# Altium footprint library Conectors.PcbLib: 122 footprints (part 8 of 8)
Each footprint in its own frame and in the unit in brackets; x right, y up, seen from the top. Pads: shape width x height; smd on the part's side, far side on the other; paste and mask are expansions set on the pad; w line width, h text height; cw(c..) or ccw(c..) is an arc to the next point about the centre after c.
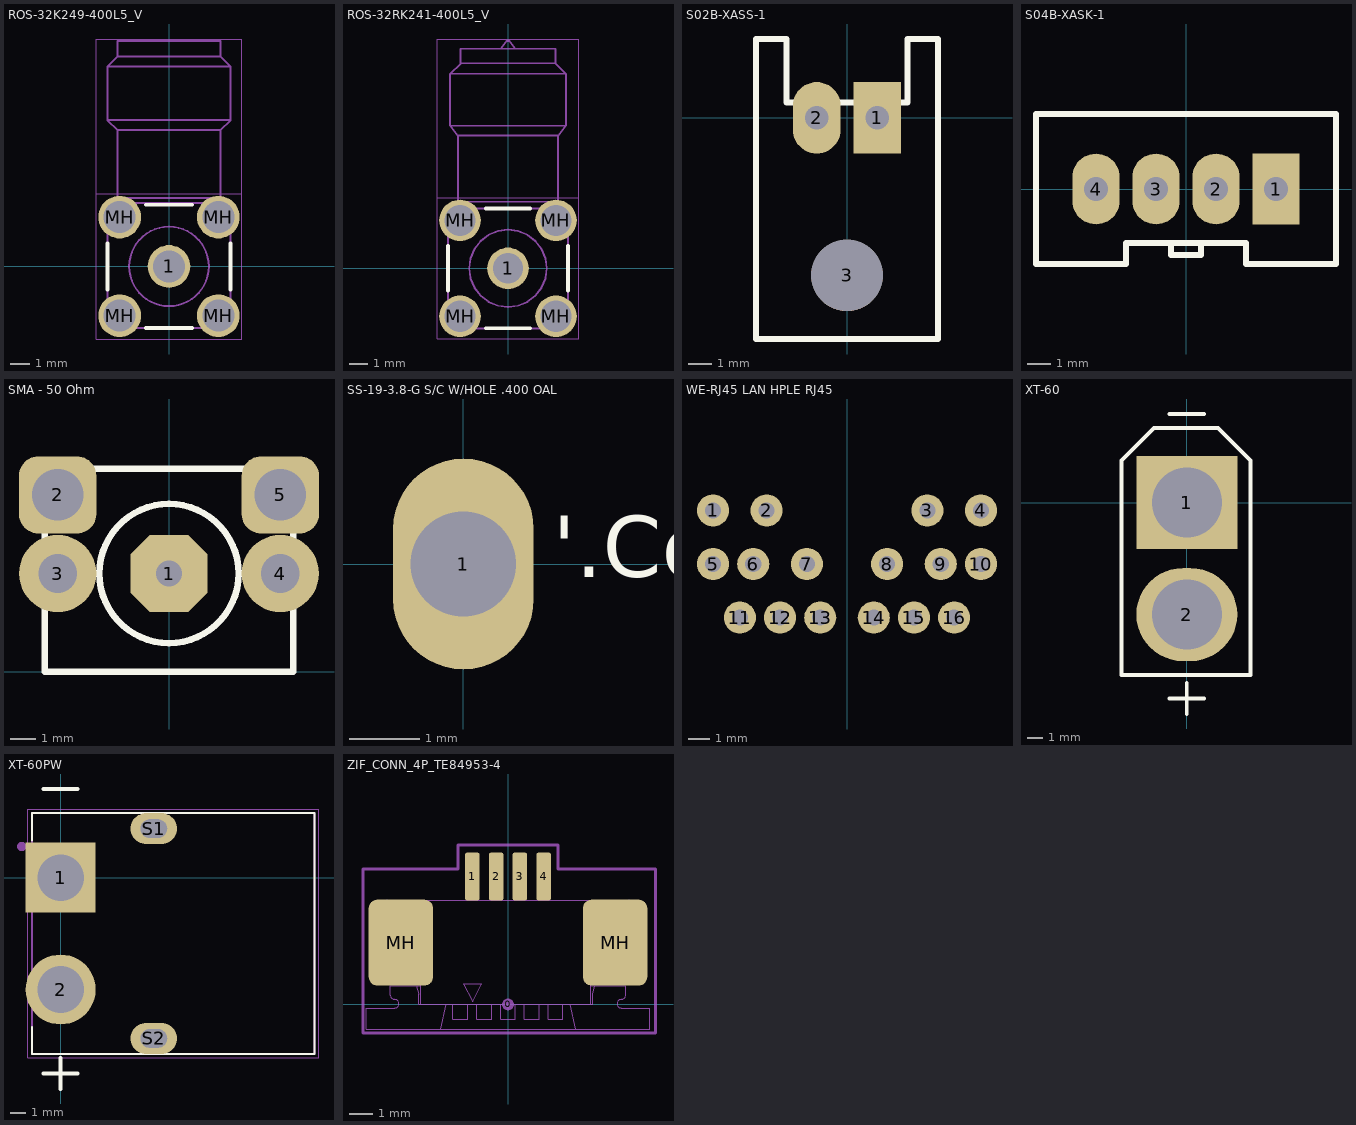
[diagram p7: the footprints below, top view; thin cyan lines are the x and y axes]

## ROS-32K249-400L5_V [mm] "SMA Right Angle Jack, 14.8x6.35x9.7mm, Rosenberger Recommended"
height 9.7
pads (5):
  round 2.2 hole 1.65: 1(0,0) MH(-2.54,-2.54) MH(-2.54,2.54) MH(2.54,-2.54) MH(2.54,2.54)
Top Overlay:
  lines w0.2: -3.175,-1.181 -3.175,1.181 ; -1.181,-3.175 1.181,-3.175 ; -1.181,3.175 1.181,3.175 ; 3.175,-1.181 3.175,1.181
Mechanical 13:
  circle w0.1: c0,0 r0.635
  circle w0.1: c0,0 r2.05
  lines w0.1: -3.175,-1.708 -2.161,-1.708 -2.02,-1.874 -1.866,-2.028 -1.7,-2.17 -1.7,-3.183 ; -3.175,1.708 -2.161,1.708 -2.02,1.874 -1.866,2.028 -1.7,2.17 -1.7,3.183 -2.9,3.183 -3.175,2.908 -3.175,-2.908 -2.9,-3.183 ; -2.9,-3.183 2.9,-3.183 ; 1.7,-3.183 1.7,-2.17 1.866,-2.028 2.02,-1.874 2.161,-1.708 3.175,-1.708 ; 2.9,-3.183 3.175,-2.908 3.175,2.908 2.9,3.183 1.7,3.183 1.7,2.17 1.866,2.028 2.02,1.874 2.161,1.708 3.175,1.708 ; -3.175,7.542 -3.175,10.292 ; -3.175,7.542 3.175,7.542 ; -3.175,7.542 -2.65,7.017 ; -3.175,10.292 3.175,10.292 ; -3.175,10.292 -2.65,10.817 ; -2.65,3.517 -2.65,7.017 ; -2.65,3.517 2.65,3.517 ; -2.65,3.517 -2.9,3.267 2.9,3.267 2.65,3.517 ; -2.65,7.017 2.65,7.017 ; -2.65,10.817 2.65,10.817 ; -2.65,10.817 -2.65,11.617 2.65,11.617 2.65,10.817 ; 2.65,3.517 2.65,7.017 ; 2.65,7.017 3.175,7.542 ; 2.65,10.817 3.175,10.292 ; 3.175,7.542 3.175,10.292 ; -3.04,-3.048 -2.04,-3.048 -2.04,-2.048 -3.04,-2.048 -3.04,-3.048 ; -3.04,2.032 -3.04,3.032 -2.04,3.032 -2.04,2.032 -3.04,2.032 ; 2.04,-3.048 2.04,-2.048 3.04,-2.048 3.04,-3.048 2.04,-3.048 ; 2.04,2.032 3.04,2.032 3.04,3.032 2.04,3.032 2.04,2.032
Mechanical 15:
  lines w0.05: -3.74,3.74 3.74,3.74 ; -3.74,-3.74 3.74,-3.74 3.74,11.717 -3.74,11.717 -3.74,-3.74
  lines w0.1: -0.5,0 0.5,0 ; 0,-0.5 0,0.5
3D body "32k249-400l5.stp": height 9.7, standoff -4, extent -3.175,-3.183 3.175,11.617

## ROS-32RK241-400L5_V [mm] "Reverse-SMA Straight Jack, 15.215x6.35x9.7mm, Rosenberger Recommended"
height 9.7
pads (5):
  round 2.2 hole 1.6: 1(0,0)
  round 2.2 hole 1.65: MH(-2.54,-2.54) MH(-2.54,2.54) MH(2.54,-2.54) MH(2.54,2.54)
Top Overlay:
  lines w0.2: -3.175,-1.181 -3.175,1.181 ; -1.181,-3.175 1.181,-3.175 ; -1.181,3.175 1.181,3.175 ; 3.175,-1.181 3.175,1.181
Mechanical 13:
  circle w0.1: c0,0 r0.635
  lines w0.1: -3.175,-2.9 -3.175,2.9 -3.086,2.995 -2.994,3.086 ; -3.175,-2.9 -3.086,-2.994 -2.995,-3.086 -2.9,-3.175 2.905,-3.175 ; -3.175,-1.7 -2.161,-1.7 ; -3.175,1.7 -2.162,1.7 ; -2.9,3.175 -2.994,3.086 ; -2.65,4.036 -2.65,7.02 -2.65,3.525 ; -2.161,-1.7 -2.02,-1.866 -1.866,-2.02 -1.7,-2.162 ; -2.162,1.7 -2.02,1.866 -1.866,2.02 -1.7,2.161 ; -1.7,-3.175 -1.7,-2.162 ; -1.7,2.161 -1.7,3.175 ; -0.375,11.625 -0.071,12.04 0.071,12.04 0.375,11.625 ; 1.7,-2.161 1.866,-2.02 2.02,-1.866 2.162,-1.7 ; 1.7,2.162 1.866,2.02 2.02,1.866 2.161,1.7 ; 1.7,-3.175 1.7,-2.161 ; 1.7,2.162 1.7,3.175 ; 2.162,-1.7 3.175,-1.7 ; 2.161,1.7 3.175,1.7 ; 2.65,4.036 2.65,7.02 2.65,3.525 ; 2.9,-3.175 2.994,-3.086 3.086,-2.995 3.175,-2.9 ; 3.175,-2.905 3.175,2.9 ; 3.175,2.9 3.086,2.994 2.995,3.086 ; -3.067,7.55 -2.65,7.025 ; -3.067,7.55 -3.067,10.3 ; -3.067,7.55 3.067,7.55 ; -3.067,7.55 -2.65,7.025 ; -3.067,7.55 -3.067,10.3 ; -3.067,10.3 -2.512,10.825 -3.067,10.3 ; -3.067,10.3 3.067,10.3 ; -2.995,3.086 -2.9,3.175 ; -2.9,3.175 -2.65,3.525 ; -2.9,3.175 2.9,3.175 ; -2.65,3.525 2.65,3.525 ; -2.65,7.025 2.65,7.025 ; -2.512,10.855 -2.512,11.625 ; -2.512,10.855 2.512,10.855 ; -2.512,10.855 -2.512,11.625 ; -2.512,11.625 2.511,11.625 -2.512,11.625 ; 2.512,10.855 2.512,11.625 2.512,10.855 ; 2.512,10.855 3.067,10.3 ; 2.512,10.855 3.067,10.3 ; 2.65,3.525 2.9,3.175 ; 2.65,7.025 3.067,7.55 ; 2.65,7.025 3.067,7.55 ; 2.9,3.175 2.995,3.086 ; 2.9,3.175 2.995,3.086 ; 3.067,7.55 3.067,10.3 ; 3.067,7.55 3.067,10.3 ; -3.04,-3.04 -2.04,-3.04 -2.04,-2.04 -3.04,-2.04 -3.04,-3.04 ; -3.04,2.04 -2.04,2.04 -2.04,3.04 -3.04,3.04 -3.04,2.04 ; -2.05,0 -1.98,0.531 -1.775,1.025 -1.449,1.45 -1.025,1.775 -0.53,1.98 0,2.05 0.531,1.98 1.025,1.775 1.45,1.449 1.775,1.025 1.98,0.53 2.05,0 1.98,-0.531 1.775,-1.025 1.449,-1.45 1.025,-1.775 0.53,-1.98 0,-2.05 -0.531,-1.98 -1.025,-1.775 -1.45,-1.449 -1.775,-1.025 -1.98,-0.53 -2.05,0 ; 2.04,-3.04 3.04,-3.04 3.04,-2.04 2.04,-2.04 2.04,-3.04 ; 2.04,2.04 3.04,2.04 3.04,3.04 2.04,3.04 2.04,2.04
Mechanical 15:
  lines w0.05: -3.74,3.74 3.74,3.74 ; -3.74,-3.74 3.74,-3.74 3.74,12.14 -3.74,12.14 -3.74,-3.74
3D body "32rk241-400l5.stp": height 9.7, standoff -4, extent -3.175,-3.175 3.175,12.04

## S02B-XASS-1 [mm] "CONN HEADER XA 2POS 2.5MM TIN"
height 11.3
pads (3):
  rect 2x3 hole 1: 1(1.27,0)
  oval 2x3 hole 1: 2(-1.27,0)
  round 3 hole 3 unplated: 3(0,-6.604)
Top Overlay:
  lines w0.254: -3.81,-9.271 3.81,-9.271 3.81,3.302 2.54,3.302 2.54,0.635 -2.54,0.635 -2.54,3.302 -3.81,3.302 -3.81,-9.271
3D body "S02B-XASS-1.STEP": height 7.6, standoff -3.5, extent -3.75,-9.253 3.75,3.347

## S04B-XASK-1 [mm] "CONN HEADER XA 4POS 2.5MM TIN"
height 11.3
pads (4):
  rect 2x3 hole 1: 1(3.81,0)
  oval 2x3 hole 1: 2(1.27,0) 3(-1.27,0) 4(-3.81,0)
Top Overlay:
  lines w0.254: -0.635,-2.286 -0.635,-2.794 0,-2.794 0.635,-2.794 0.635,-2.286 ; -6.35,-3.175 -6.35,3.175 6.35,3.175 6.35,-3.175 2.54,-3.175 2.54,-2.286 -2.54,-2.286 -2.54,-3.175 -6.35,-3.175
3D body "S04B-XASK-1.STEP": height 7.6, standoff -3.5, extent -6.25,-9.38 6.25,3.22

## SMA - 50 Ohm [mm]
pads (5):
  oct 3x3 hole 1: 1(0,3.81)
  rrect50% 3x3 hole 2: 2(-4.318,6.858) 5(4.318,6.858)
  round 3 hole 1.5: 3(-4.318,3.81) 4(4.318,3.81)
Top Overlay:
  circle w0.254: c0,3.81 r2.7
  lines w0.254: -4.826,0 -4.826,7.874 4.826,7.874 4.826,0 -4.826,0
3D body "User Library-Johnson Components SMA - 50 Ohm Connectors 142-0701-801.step": height 11.6, standoff -2.67, extent -4.76,0 4.76,7.92

## SS-19-3.8-G S/C W/HOLE .400 OAL [mm]
pads (1):
  oval 2x3 hole 1.5: 1(0,0)
Top Overlay:
  text "'.Comment'" at 1.27,-0.481 h1.5
3D body: height 6.76, standoff -2, extent -0.568,-0.569 0.568,0.569
3D body: height 8.16, standoff -2, extent -0.568,-0.569 0.568,0.569
3D body: height 5.24, standoff -2, extent -0.682,-0.683 0.682,0.684

## WE-RJ45 LAN HPLE RJ45 [mil] "WE-RJ45 LAN HPLE RJ45 LAN Transformer"
pads (16):
  round 60 hole 30: 1(-250,575) 2(-150,575) 3(150,575) 4(250,575) 5(-250,475) 6(-175,475) 7(-75,475) 8(75,475) 9(175,475) 10(250,475) 11(-200,375) 12(-125,375) 13(-50,375) 14(50,375) 15(125,375) 16(200,375)
3D body "User Library-WE-RJ45 LAN HPLE RJ45 LAN Transformer_799111614_WurthElektronik.step": height 586.61, standoff -157.48, extent -391.14,-650 391.14,650

## XT-60 [mm]
pads (2):
  rect 6.5x6 hole 4.5: 1(0,0)
  oval 6.5x6 hole 4.5: 2(0,-7.2)
Top Overlay:
  lines w0.25: -1.1,-12.6 1.1,-12.6 ; -1.1,5.7 1.1,5.7 ; 0,-13.6 0,-11.6 ; -4.2,-11.1 4.1,-11.1 4.1,2.7 2,4.8 -2.1,4.8 -4.2,2.7 -4.2,-11.1
3D body "XT60 male.step": height 20, standoff -1.2, extent -4.1,-11.15 4.05,4.75

## XT-60PW [mm]
pads (4):
  rect 4.5x4.5 hole 3: 1(0,0)
  round 4.5 hole 3: 2(0,-7.2)
  oval 3x2 hole 1.2 slot 1.7 at 0 deg: S1(6,3.15) S2(6,-10.35)
Top Overlay:
  lines w0.127: -1.85,-9.6 -1.85,-11.35 16.35,-11.35 16.35,4.15 -1.85,4.15 -1.85,2.4
  lines w0.25: -1.1,-12.6 1.1,-12.6 ; -1.1,5.7 1.1,5.7 ; 0,-13.6 0,-11.6
Mechanical 13:
  circle w0.3: c-2.5,2 r0.15
  lines w0.127: -1.85,-11.35 -1.85,4.15 16.35,4.15 16.35,-11.35 -1.85,-11.35
Mechanical 15:
  lines w0.05: -2.1,-11.6 16.6,-11.6 16.6,4.4 -2.1,4.4 -2.1,-11.6
3D body "XT60IPW.step": height 8.2, standoff -2.75, extent -1.3,-11.25 16.3,4.25

## ZIF_CONN_4P_TE84953-4 [mm] "TE Connectivity 4-pin ZIF connector"
height 2.74
pads (7):
  round 0.5 on Mech15: 0(0,0)
  rrect25% 0.61x2 smd: 1(-1.5,5.375) 2(-0.5,5.375) 3(0.5,5.375) 4(1.5,5.375)
  rrect25% 2.7x3.6 smd: MH(-4.5,2.6) MH(4.5,2.6)
Mechanical 13:
  lines w0.05: -4.56,3.1 -3.93,3.1 ; -4.56,4.37 -4.56,0.87 -3.67,0.87 -3.67,0 ; -4.28,4.37 -4.18,3.997 -4.18,3.1 ; -4.18,0.86 -4.18,0.87 ; -3.982,0.87 -3.982,0.86 -5.072,0.86 cw(c-5.072,0.96) -5.172,0.96 -5.172,1.261 cw(c-5.072,1.261) -5.072,1.361 -4.762,1.361 ccw(c-4.762,1.461) -4.662,1.461 -4.662,1.763 ccw(c-4.762,1.763) -4.762,1.863 -5.072,1.863 cw(c-5.072,1.963) -5.172,1.963 -5.172,2.264 cw(c-5.072,2.264) -5.072,2.364 -4.762,2.364 ccw(c-4.762,2.464) -4.662,2.464 -4.662,2.766 ccw(c-4.762,2.766) -4.762,2.866 -5.072,2.866 cw(c-5.072,2.966) -5.172,2.966 -5.172,3.267 cw(c-5.072,3.267) -5.072,3.367 -4.762,3.367 ccw(c-4.762,3.467) -4.662,3.467 -4.662,3.769 ccw(c-4.762,3.769) -4.762,3.869 -5.072,3.869 cw(c-5.072,3.969) -5.172,3.969 -5.172,4.27 cw(c-5.072,4.27) -5.072,4.37 5.072,4.37 cw(c5.072,4.27) 5.172,4.27 5.172,3.969 cw(c5.072,3.969) 5.072,3.869 4.762,3.869 ccw(c4.762,3.769) 4.662,3.769 4.662,3.467 ccw(c4.762,3.467) 4.762,3.367 5.072,3.367 cw(c5.072,3.267) 5.172,3.267 5.172,2.966 cw(c5.072,2.966) 5.072,2.866 4.762,2.866 ccw(c4.762,2.766) 4.662,2.766 4.662,2.464 ccw(c4.762,2.464) 4.762,2.364 5.072,2.364 cw(c5.072,2.264) 5.172,2.264 5.172,1.963 cw(c5.072,1.963) 5.072,1.863 4.762,1.863 ccw(c4.762,1.763) 4.662,1.763 4.662,1.461 ccw(c4.762,1.461) 4.762,1.361 5.072,1.361 cw(c5.072,1.261) 5.172,1.261 5.172,0.96 cw(c5.072,0.96) 5.072,0.86 4.232,0.86 4.229,0.87 ; -3.93,0.87 -3.93,3.997 -3.83,4.37 ; -3.846,0.79 -3.75,0.43 -3.75,0 3.55,0 3.55,0.43 3.646,0.79 ; -3.67,0.79 -4.94,0.79 -4.94,0.39 ccw(c-4.76,0.39) -4.76,0.21 cw(c-4.76,0.03) -4.76,-0.15 -5.96,-0.15 -5.96,-1.04 5.96,-1.04 5.96,-0.15 4.76,-0.15 cw(c4.76,0.03) 4.76,0.21 ccw(c4.76,0.39) 4.94,0.39 4.94,0.79 3.47,0.79 ; -2.82,-1.04 -2.59,0 ; -2.311,0 -2.311,-0.63 -1.691,-0.63 -1.691,0 ; -1.596,4.37 -1.596,5.51 -1.396,5.51 -1.396,4.37 ; -1.596,4.88 -1.396,4.88 ; -1.596,5.01 -1.396,5.01 ; -1.596,5.38 -1.396,5.38 ; -1.311,0 -1.311,-0.63 -0.691,-0.63 -0.691,0 ; -0.596,4.37 -0.596,5.51 -0.396,5.51 -0.396,4.37 ; -0.596,4.88 -0.396,4.88 ; -0.596,5.01 -0.396,5.01 ; -0.596,5.38 -0.396,5.38 ; -0.31,0 -0.31,-0.63 0.309,-0.63 0.309,0 ; 0.405,4.37 0.405,5.51 0.604,5.51 0.604,4.37 ; 0.405,4.88 0.604,4.88 ; 0.405,5.01 0.604,5.01 ; 0.405,5.38 0.604,5.38 ; 0.69,0 0.69,-0.63 1.309,-0.63 1.309,0 ; 1.405,4.37 1.405,5.51 1.605,5.51 1.605,4.37 ; 1.405,4.88 1.605,4.88 ; 1.405,5.01 1.605,5.01 ; 1.405,5.38 1.605,5.38 ; 1.69,0 1.69,-0.63 2.31,-0.63 2.31,0 ; 2.59,0 2.82,-1.04 ; 3.47,0 3.47,0.87 4.56,0.87 4.56,4.37 ; 3.83,0.87 3.93,1.243 3.93,4.37 ; 3.93,2.14 4.18,2.14 4.18,1.243 4.28,0.87 ; 4.18,1.92 4.56,1.92 ; -1.871,0.87 -1.49,0.11 -1.111,0.87 -1.871,0.87
Mechanical 15:
  lines w0.127: -6.1,-1.2 6.2,-1.2 6.2,5.7 2.1,5.7 2.1,6.7 -2.1,6.7 -2.1,5.7 -6.1,5.7 -6.1,-1.2
3D body "ZIF Conn TE 84953-4.STEP": height 2.58, standoff 0, extent -5.96,-1.04 5.96,5.51